# Altium footprint library ADNB95C.PcbLib: 249 footprints (part 3 of 16)
Each footprint in its own frame and in the unit in brackets; x right, y up, seen from the top. Pads: shape width x height; smd on the part's side, far side on the other; paste and mask are expansions set on the pad; w line width, h text height; cw(c..) or ccw(c..) is an arc to the next point about the centre after c.
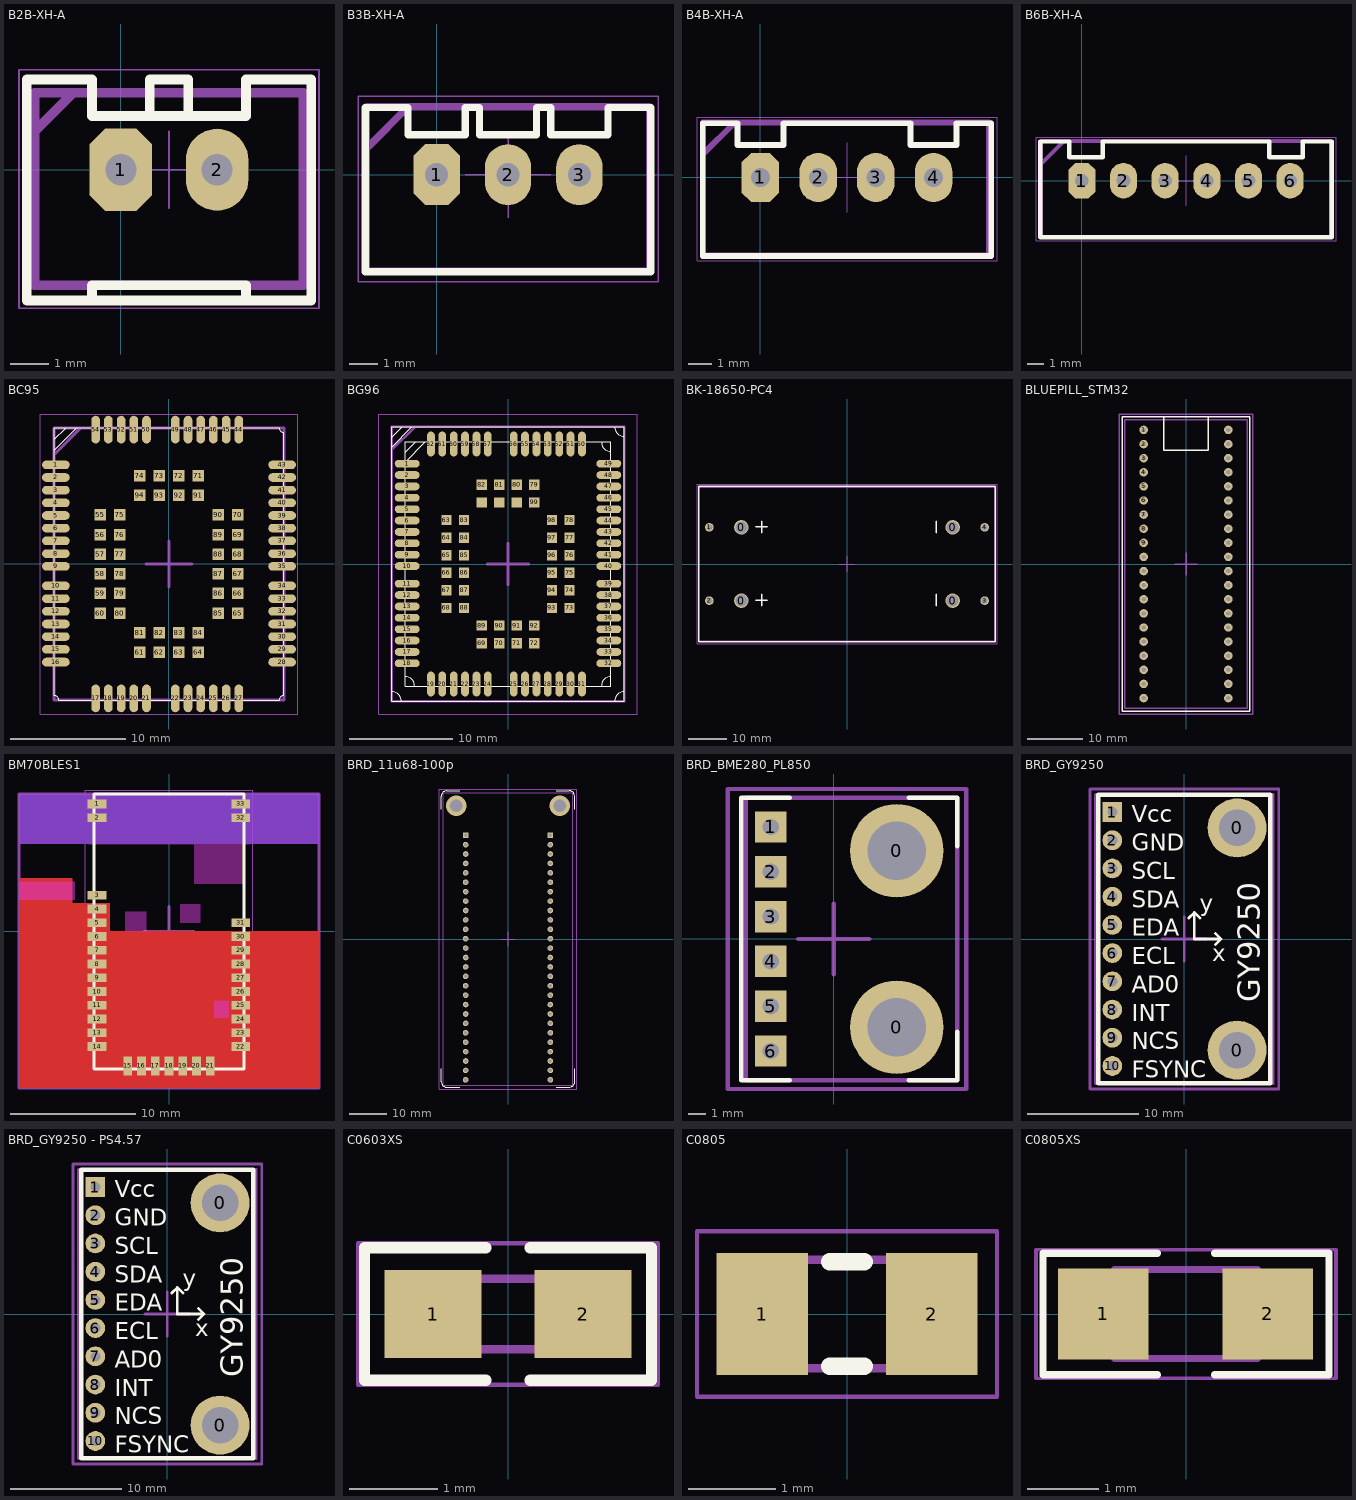
[diagram p2: the footprints below, top view; thin cyan lines are the x and y axes]

## B2B-XH-A [mil] "WAFER Connector 2 Pins,Pitch 2.50mm, Straight Type  Single Row"
height 275.59
pads (2):
  oct 64x84 hole 32: 1(0,0)
  oval 64x84 hole 32: 2(98.43,0)
Top Overlay:
  lines w10: -96.46,90.55 -96.46,-133.86 194.88,-133.86 194.88,90.55 ; -96.46,92.52 -29.53,92.52 -29.53,55.12 127.95,55.12 127.95,92.52 194.88,92.52 ; -29.53,-133.86 -29.53,-118.11 127.95,-118.11 127.95,-133.86 ; 29.53,55.12 29.53,92.52 68.9,92.52 68.9,55.12
Top Designator (Mech7):
  text ".Designator" at -250.69,-108.58 h60
Top Assembly:
  lines w10: -88.58,39.37 -49.21,78.74 ; -88.58,-118.11 -88.58,78.74 187.01,78.74 187.01,-118.11 -88.58,-118.11
Top Courtyard:
  lines w1.97: 9.84,0 88.58,0 ; 49.21,-39.37 49.21,39.37 ; -104.33,-141.73 -104.33,102.36 202.76,102.36 202.76,-141.73 -104.33,-141.73
3D body "User Library-CONN, HDR, 2_5mm X 2.STEP": height 280.5, standoff -149.5, extent -96.28,-133.48 194.72,92.52

## B3B-XH-A [mil] "WAFER Connector 3 Pins,Pitch 2.50mm, Straight Type  Single Row"
height 275.59
pads (3):
  oct 64x84 hole 32: 1(0,0)
  oval 64x84 hole 32: 2(98.43,0) 3(196.85,0)
Top Overlay:
  lines w10: -98.43,90.55 -98.43,-133.86 295.28,-133.86 295.28,90.55 ; -98.43,92.52 -39.37,92.52 -39.37,55.12 39.37,55.12 39.37,92.52 59.06,92.52 59.06,55.12 137.8,55.12 137.8,92.52 157.48,92.52 157.48,55.12 236.22,55.12 236.22,92.52 295.28,92.52
Top Designator (Mech7):
  text ".Designator" at -201.48,-108.58 h60
Top Assembly:
  lines w10: -96.46,39.37 -93.5,39.37 -39.37,93.5 ; -96.46,-132.88 -96.46,93.5 293.3,93.5 293.3,-132.88 -96.46,-132.88
Top Courtyard:
  lines w1.97: 39.37,0 157.48,0 ; 98.43,-59.06 98.43,59.06 ; -108.27,-147.64 -108.27,108.27 305.12,108.27 305.12,-147.64 -108.27,-147.64
3D body "User Library-jst-b3b-xh-a.STEP": height 276.09, standoff -133.36, extent -96.46,-132.88 293.31,93.5

## B4B-XH-A [mil] "WAFER Connector 4 Pins,Pitch 2.50mm, Straight Type  Single Row"
height 275.59
pads (4):
  oct 64x84 hole 32: 1(0,0)
  oval 64x84 hole 32: 2(98.43,0) 3(196.85,0) 4(295.28,0)
Top Overlay:
  lines w10: -98.43,90.55 -98.43,-133.86 393.7,-133.86 393.7,90.55 ; -98.43,92.52 -39.37,92.52 -39.37,55.12 39.37,55.12 39.37,92.52 255.91,92.52 255.91,55.12 334.65,55.12 334.65,92.52 393.7,92.52
Top Designator (Mech7):
  text ".Designator" at -152.27,-108.58 h60
Top Assembly:
  lines w10: -98.42,39.37 -44.29,93.5 -29.53,93.5 ; -98.42,-132.88 389.77,-132.88 389.77,93.5 -98.42,93.5 -98.42,-132.88
Top Courtyard:
  lines w1.97: 88.58,0 206.69,0 ; 147.64,-59.06 147.64,59.06 ; -108.27,-141.73 403.54,-141.73 403.54,102.36 -108.27,102.36 -108.27,-141.73
3D body "User Library-HEADER,JST,BxB-XH-A.sldprt": height 276.09, standoff -133.36, extent -98.42,-132.87 389.77,93.51

## B6B-XH-A [mil] "WAFER Connector 6 Pins,Pitch 2.50mm, Straight Type  Single Row"
height 275.59
pads (6):
  oct 64x84 hole 32: 1(0,0)
  oval 64x84 hole 32: 2(98.43,0) 3(196.85,0) 4(295.28,0) 5(393.7,0) 6(492.13,0)
Top Overlay:
  lines w10: -98.43,-133.86 -98.43,92.52 -29.53,92.52 -29.53,55.12 49.21,55.12 49.21,92.52 442.91,92.52 442.91,55.12 521.65,55.12 521.65,92.52 590.55,92.52 590.55,-133.86 -98.43,-133.86
Top Designator (Mech7):
  text ".Designator" at -53.84,-108.58 h60
Top Assembly:
  lines w10: -96.46,39.37 -42.33,93.5 -29.53,93.5 ; -96.46,-132.88 588.58,-132.88 588.58,93.5 -96.46,93.5 -96.46,-132.88
Top Courtyard:
  lines w1.97: 187.01,0 305.12,0 ; 246.06,-59.06 246.06,59.06 ; -108.27,-141.73 -108.27,102.36 600.39,102.36 600.39,-141.73 -108.27,-141.73
3D body "User Library-jst-b6b-xh-a.STEP": height 276.09, standoff -133.36, extent -96.46,-132.88 588.58,93.5

## BC95 [mm]
height 2.5
pads (94):
  oval 2.4x0.75 smd mask+0.076: 1(-9.8,8.6) 2(-9.8,7.5) 3(-9.8,6.4) 4(-9.8,5.3) 5(-9.8,4.2) 6(-9.8,3.1) 7(-9.8,2) 8(-9.8,0.9) 9(-9.8,-0.2) 10(-9.8,-1.9) 11(-9.8,-3) 12(-9.8,-4.1) 13(-9.8,-5.2) 14(-9.8,-6.3) 15(-9.8,-7.4) 16(-9.8,-8.5) 28(9.8,-8.5) 29(9.8,-7.4) 30(9.8,-6.3) 31(9.8,-5.2) 32(9.8,-4.1) 33(9.8,-3) 34(9.8,-1.9) 35(9.8,-0.2) 36(9.8,0.9) 37(9.8,2) 38(9.8,3.1) 39(9.8,4.2) 40(9.8,5.3) 41(9.8,6.4) 42(9.8,7.5) 43(9.8,8.6)
  oval 0.75x2.4 smd mask+0.076: 17(-6.35,-11.65) 18(-5.25,-11.65) 19(-4.15,-11.65) 20(-3.05,-11.65) 21(-1.95,-11.65) 22(0.55,-11.65) 23(1.65,-11.65) 24(2.75,-11.65) 25(3.85,-11.65) 26(4.95,-11.65) 27(6.05,-11.65) 44(6.05,11.65) 45(4.95,11.65) 46(3.85,11.65) 47(2.75,11.65) 48(1.65,11.65) 49(0.55,11.65) 50(-1.95,11.65) 51(-3.05,11.65) 52(-4.15,11.65) 53(-5.25,11.65) 54(-6.35,11.65)
  rect 1x1 smd mask+0.076: 55(-5.95,4.25) 56(-5.95,2.55) 57(-5.95,0.85) 58(-5.95,-0.85) 59(-5.95,-2.55) 60(-5.95,-4.25) 61(-2.55,-7.65) 62(-0.85,-7.65) 63(0.85,-7.65) 64(2.55,-7.65) 65(5.95,-4.25) 66(5.95,-2.55) 67(5.95,-0.85) 68(5.95,0.85) 69(5.95,2.55) 70(5.95,4.25) 71(2.55,7.65) 72(0.85,7.65) 73(-0.85,7.65) 74(-2.55,7.65) 75(-4.25,4.25) 76(-4.25,2.55) 77(-4.25,0.85) 78(-4.25,-0.85) 79(-4.25,-2.55) 80(-4.25,-4.25) 81(-2.55,-5.95) 82(-0.85,-5.95) 83(0.85,-5.95) 84(2.55,-5.95) 85(4.25,-4.25) 86(4.25,-2.55) 87(4.25,-0.85) 88(4.25,0.85) 89(4.25,2.55) 90(4.25,4.25) 91(2.55,5.95) 92(0.85,5.95) 93(-0.85,5.95) 94(-2.55,5.95)
Top Overlay:
  lines w0.1: -9.95,9.851 -8.001,11.8 -9.271,11.8 ; -9.95,10.033 -9.95,11.375 ; -9.95,10.414 -9.95,11.8 ; -9.931,10.82 -8.966,11.786 ; -8.437,11.8 -9.95,11.8 ; -9.95,11.8 9.55,11.8 ccw(c9.95,11.8) 9.95,11.4 9.95,-11.4 ccw(c9.95,-11.8) 9.55,-11.8 -9.55,-11.8 ccw(c-9.95,-11.8) -9.95,-11.4 -9.95,11.8
Top Designator (Mech7):
  text ".Designator" at -7.618,-0.508 h1.52
Top Assembly:
  lines w0.254: -9.95,9.5 -7.65,11.8 -7.5,11.8 ; -9.95,-11.8 9.95,-11.8 9.95,11.8 -9.95,11.8 -9.95,-11.8
Top Courtyard:
  lines w0.1: -11.15,-13 11.15,-13 11.15,13 -11.15,13 -11.15,-13
  lines w0.254: -2,0 2,0 ; 0,-2 0,2
3D body "BC95_prt.SLDPRT": height 2.2, standoff 0, extent -9.95,-11.8 9.95,11.8

## BG96 [mm] "BG96 IoT NB/Cat.M1 RF Module  Quectel"
height 2.5
pads (102):
  oval 2.4x0.75 smd mask+0.076: 1(-9.75,9.7) 2(-9.75,8.6) 3(-9.75,7.5) 4(-9.75,6.4) 5(-9.75,5.3) 6(-9.75,4.2) 7(-9.75,3.1) 8(-9.75,2) 9(-9.75,0.9) 10(-9.75,-0.2) 11(-9.75,-1.9) 12(-9.75,-3) 13(-9.75,-4.1) 14(-9.75,-5.2) 15(-9.75,-6.3) 16(-9.75,-7.4) 17(-9.75,-8.5) 18(-9.75,-9.6) 32(9.75,-9.6) 33(9.75,-8.5) 34(9.75,-7.4) 35(9.75,-6.3) 36(9.75,-5.2) 37(9.75,-4.1) 38(9.75,-3) 39(9.75,-1.9) 40(9.75,-0.2) 41(9.75,0.9) 42(9.75,2) 43(9.75,3.1) 44(9.75,4.2) 45(9.75,5.3) 46(9.75,6.4) 47(9.75,7.5) 48(9.75,8.6) 49(9.75,9.7)
  oval 0.75x2.4 smd mask+0.076: 19(-7.45,-11.6) 20(-6.35,-11.6) 21(-5.25,-11.6) 22(-4.15,-11.6) 23(-3.05,-11.6) 24(-1.95,-11.6) 25(0.55,-11.6) 26(1.65,-11.6) 27(2.75,-11.6) 28(3.85,-11.6) 29(4.95,-11.6) 30(6.05,-11.6) 31(7.15,-11.6) 50(7.15,11.6) 51(6.05,11.6) 52(4.95,11.6) 53(3.85,11.6) 54(2.75,11.6) 55(1.65,11.6) 56(0.55,11.6) 57(-1.95,11.6) 58(-3.05,11.6) 59(-4.15,11.6) 60(-5.25,11.6) 61(-6.35,11.6) 62(-7.45,11.6)
  rect 1x1 smd mask+0.076: 63(-5.95,4.25) 64(-5.95,2.55) 65(-5.95,0.85) 66(-5.95,-0.85) 67(-5.95,-2.55) 68(-5.95,-4.25) 69(-2.55,-7.65) 70(-0.85,-7.65) 71(0.85,-7.65) 72(2.55,-7.65) 73(5.95,-4.25) 74(5.95,-2.55) 75(5.95,-0.85) 76(5.95,0.85) 77(5.95,2.55) 78(5.95,4.25) 79(2.55,7.65) 80(0.85,7.65) 81(-0.85,7.65) 82(-2.55,7.65) 83(-4.25,4.25) 84(-4.25,2.55) 85(-4.25,0.85) 86(-4.25,-0.85) 87(-4.25,-2.55) 88(-4.25,-4.25) 89(-2.55,-5.95) 90(-0.85,-5.95) 91(0.85,-5.95) 92(2.55,-5.95) 93(4.25,-4.25) 94(4.25,-2.55) 95(4.25,-0.85) 96(4.25,0.85) 97(4.25,2.55) 98(4.25,4.25) 99(2.55,5.95) 100(0.85,5.95) 101(-0.85,5.95) 102(-2.55,5.95)
Top Overlay:
  lines w0.1: -11.25,-12.33 cw(c-11.25,-13.25) -10.33,-13.25 ; -11.25,11.301 -9.301,13.25 ; -11.231,12.27 -10.266,13.236 ; -9.95,-10.88 cw(c-9.95,-11.8) -9.03,-11.8 ; -9.95,9.851 -8.001,11.8 -9.271,11.8 ; -9.95,10.033 -9.95,11.375 ; -9.95,10.414 -9.95,11.8 ; -9.931,10.82 -8.966,11.786 ; -8.437,11.8 -9.95,11.8 ; 9.03,-11.8 cw(c9.95,-11.8) 9.95,-10.88 ; 9.03,11.8 ccw(c9.95,11.8) 9.95,10.88 ; 10.33,-13.25 cw(c11.25,-13.25) 11.25,-12.33 ; 10.33,13.25 ccw(c11.25,13.25) 11.25,12.33 ; -9.95,11.8 9.95,11.8 9.95,-11.8 -9.95,-11.8 -9.95,11.8 ; -11.25,-13.25 11.25,-13.25 11.25,13.25 -11.25,13.25 -11.25,-13.25
Top Designator (Mech7):
  text ".Designator" at -7.618,-0.508 h1.52
Top Assembly:
  lines w0.254: -11.25,11 -9,13.25 ; -9,13.25 -9,13.25 ; -11.25,-13.25 11.25,-13.25 11.25,13.25 -11.25,13.25 -11.25,-13.25
Top Courtyard:
  lines w0.1: -12.5,-14.5 12.5,-14.5 12.5,14.5 -12.5,14.5 -12.5,-14.5
  lines w0.254: -2,0 2,0 ; 0,-2 0,2
3D body "BG96_prt.SLDPRT": height 2.3, standoff 0, extent -11.25,-13.25 11.25,13.25

## BK-18650-PC4 [mm] "18650 Battery Holder 2 cell BK-18650-PC4"
height 21.54
pads (8):
  round 3.81 hole 3.2: 0(-27.81,-9.65) 0(-27.81,9.65) 0(27.81,-9.65) 0(27.81,9.65)
  round 2.286 hole 1.6: 1(-36.25,9.65) 2(-36.25,-9.65) 3(36.25,-9.65) 4(36.25,9.65)
Top Overlay:
  lines w0.4: -24,-9.5 -21,-9.5 ; -24,9.75 -21,9.75 ; -22.5,-11 -22.5,-8 ; -22.5,8.25 -22.5,11.25 ; 23.5,-11 23.5,-8 ; 23.5,8.25 23.5,11.25 ; -39,-20.5 -39,20.5 39,20.5 39,-20.5 -39,-20.5
Top Designator (Mech7):
  text ".Designator" at -7.618,-0.508 h1.52
Top Assembly:
  lines w0.254: -39,-20.25 39,-20.25 39,20.25 -39,20.25 -39,-20.25
Top Courtyard:
  lines w0.254: -2,0 2,0 ; 0,-2 0,2 ; -39.5,-21 -39.5,21 39.5,21 39.5,-21 -39.5,-21
3D body "????? ?????????????? BC-18650-PC4.step": height 21.5, standoff -3.2, extent -39,-20.25 39,20.25

## BLUEPILL_STM32 [mil]
pads (40):
  round 60 hole 30: 1(-300,950) 2(-300,850) 3(-300,750) 4(-300,650) 5(-300,550) 6(-300,450) 7(-300,350) 8(-300,250) 9(-300,150) 10(-300,50) 11(-300,-50) 12(-300,-150) 13(-300,-250) 14(-300,-350) 15(-300,-450) 16(-300,-550) 17(-300,-650) 18(-300,-750) 19(-300,-850) 20(-300,-950) 21(300,-950) 22(300,-850) 23(300,-750) 24(300,-650) 25(300,-550) 26(300,-450) 27(300,-350) 28(300,-250) 29(300,-150) 30(300,-50) 31(300,50) 32(300,150) 33(300,250) 34(300,350) 35(300,450) 36(300,550) 37(300,650) 38(300,750) 39(300,850) 40(300,950)
Top Overlay:
  lines w10: -157.48,1043.31 -157.48,807.09 157.48,807.09 157.48,1043.31 ; -452.76,-1043.31 -452.76,1043.31 452.76,1043.31 452.76,-1043.31 -452.76,-1043.31
Top Designator (Mech7):
  text ".Designator" at -299.9,-19.99 h60
Top Assembly:
  lines w10: -433.07,-1023.62 433.07,-1023.62 433.07,1023.62 -433.07,1023.62 -433.07,-1023.62
Top Courtyard:
  lines w10: -78.74,0 78.74,0 ; 0,-78.74 0,78.74 ; -472.44,-1062.99 -472.44,1062.99 472.44,1062.99 472.44,-1062.99 -472.44,-1062.99
3D body "HDR1x20.SLDPRT": height 334.65, standoff -129.92, extent -350,-1011.81 -250,1011.81
3D body "HDR1x20.SLDPRT": height 335.15, standoff -129.42, extent 250.01,-1011.81 350.01,1011.82

## BM70BLES1 [mm] "Footprint for BM70BLES1FC2"
pads (33):
  rect 1.5x0.7 smd: 1(-5.75,10.2) 2(-5.75,9.1) 3(-5.75,2.9) 4(-5.75,1.8) 5(-5.75,0.7) 6(-5.75,-0.4) 7(-5.75,-1.5) 8(-5.75,-2.6) 9(-5.75,-3.7) 10(-5.75,-4.8) 11(-5.75,-5.9) 12(-5.75,-7) 13(-5.75,-8.1) 14(-5.75,-9.2) 22(5.75,-9.2) 23(5.75,-8.1) 24(5.75,-7) 25(5.75,-5.9) 26(5.75,-4.8) 27(5.75,-3.7) 28(5.75,-2.6) 29(5.75,-1.5) 30(5.75,-0.4) 31(5.75,0.7) 32(5.75,9.1) 33(5.75,10.2)
  rect 0.7x1.5 smd: 15(-3.3,-10.75) 16(-2.2,-10.75) 17(-1.1,-10.75) 18(0,-10.75) 19(1.1,-10.75) 20(2.2,-10.75) 21(3.3,-10.75)
Top Layer:
  pour cut-out: 12,0 -4.75,0 -4.75,2.25 -7.75,2.25 -7.75,4.25 -12,4.25 -12,-12.5 12,-12.5
Top Layer keep-out:
  rectangle: -12,2.5 -7.5,4
  rectangle: -3.5,0 -1.8,1.6
  rectangle: 0.9,0.7 2.5,2.2
  rectangle: 2,3.8 6,7
  rectangle: 3.6,-6.9 4.8,-5.5
  region: -6.4,7 -6.4,8.4 -4.5,8.4 -4.5,11 4.5,11 4.5,8.4 6.4,8.4 6.4,7
Bottom Layer:
  pour cut-out: 12,0 12,-12.5 -12,-12.5 -12,2.25 -4.75,2.25 -4.75,0
Bottom Layer keep-out:
  rectangle: -12,7 12,11
Top Overlay:
  lines w0.254: -6,-11 6,-11 6,11 -6,11 -6,-11
Mechanical 1:
  lines w0.254: -12,-12.5 12,-12.5 12,11 -12,11 -12,-12.5
Top Designator (Mech7):
  text ".Designator" at -7.618,-1.146 h1.52
Top Assembly:
  lines w0.1: -6,-11 6,-11 6,11 -6,11 -6,-11
Top Courtyard:
  lines w0.1: -6.7,-11.7 6.7,-11.7 6.7,11.3 -6.7,11.3 -6.7,-11.7
  lines w0.254: -2,0 2,0 ; 0,-2 0,2
3D body "RN4870 v4.step": height 2.42, standoff 0.01, extent -6,-11 6,11

## BRD_11u68-100p [mil]
pads (54):
  rect 60x60 hole 35.43: 1(-450,1103.15) 28(450,1103.15)
  round 60 hole 35.43: 2(-450,1003.15) 3(-450,903.15) 4(-450,803.15) 5(-450,703.15) 6(-450,603.15) 7(-450,503.15) 8(-450,403.15) 9(-450,303.15) 10(-450,203.15) 11(-450,103.15) 12(-450,3.15) 13(-450,-96.85) 14(-450,-196.85) 15(-450,-296.85) 16(-450,-396.85) 17(-450,-496.85) 18(-450,-596.85) 19(-450,-696.85) 20(-450,-796.85) 21(-450,-896.85) 22(-450,-996.85) 23(-450,-1096.85) 24(-450,-1196.85) 25(-450,-1296.85) 26(-450,-1396.85) 27(-450,-1496.85) 29(450,1003.15) 30(450,903.15) 31(450,803.15) 32(450,703.15) 33(450,603.15) 34(450,503.15) 35(450,403.15) 36(450,303.15) 37(450,203.15) 38(450,103.15) 39(450,3.15) 40(450,-96.85) 41(450,-196.85) 42(450,-296.85) 43(450,-396.85) 44(450,-496.85) 45(450,-596.85) 46(450,-696.85) 47(450,-796.85) 48(450,-896.85) 49(450,-996.85) 50(450,-1096.85) 51(450,-1196.85) 52(450,-1296.85) 53(450,-1396.85) 54(450,-1496.85)
via 551.18,1416.53 diameter 216.54 hole 129.92
via -551.18,1416.53 diameter 216.54 hole 129.92
Top Overlay:
  lines w10: -709.45,1377.95 -709.45,1514.96 ; -709.45,1515.75 cw(c-650.39,1515.75) -650.39,1574.8 ; -708.66,-1516.54 ccw(c-649.61,-1516.54) -649.61,-1575.59 ; -708.66,-1515.75 -708.66,-1377.95 ; -649.61,1574.8 -511.81,1574.8 ; -648.82,-1575.59 -511.81,-1575.59 ; 511.81,-1574.8 649.61,-1574.8 ; 511.81,1575.59 648.82,1575.59 ; 649.61,1575.59 cw(c649.61,1516.54) 708.66,1516.54 ; 650.39,-1574.8 ccw(c650.39,-1515.75) 709.45,-1515.75 ; 708.66,1377.95 708.66,1515.75 ; 709.45,-1514.96 709.45,-1377.95
Top Designator (Mech7):
  text ".Designator" at -299.9,-19.99 h60
Top Assembly:
  lines w10: -688.98,-1555.12 -688.98,1555.12 688.98,1555.12 688.98,-1555.12 -688.98,-1555.12
Top Courtyard:
  lines w10: -78.74,0 78.74,0 ; 0,-78.74 0,78.74 ; -728.35,-1594.49 728.35,-1594.49 728.35,1594.49 -728.35,1594.49 -728.35,-1594.49
3D body "1x27F_HEADER.SLDPRT": height 334.65, standoff -137.8, extent 400,-1535.04 500,1164.96
3D body "1x27F_HEADER.SLDPRT": height 334.65, standoff -137.8, extent -500,-1535.04 -400,1164.96

## BRD_BME280_PL850 [mil] "SAMTECH 2.54mm Header 4.85mm insulator"
height 179.92
pads (8):
  round 208.66 hole 129.92: 0(140.62,-196.85) 0(140.62,196.85)
  rect 70x70 hole 36: 1(-140.62,250) 2(-140.62,150) 3(-140.62,50) 4(-140.62,-50) 5(-140.62,-150) 6(-140.62,-250)
Top Overlay:
  lines w10: -98.43,-314.96 -206.69,-314.96 -206.69,314.96 -98.43,314.96 ; 167.32,-314.96 275.59,-314.96 275.59,-206.69 ; 167.32,314.96 275.59,314.96 275.59,206.69
Top Designator (Mech7):
  text ".Designator" at -265.45,-19.99 h60
Top Assembly:
  lines w10: -196.85,-314.96 -196.85,314.96 275.59,314.96 275.59,-314.96 -196.85,-314.96
Top Courtyard:
  lines w10: -78.74,0 78.74,0 ; 0,-78.74 0,78.74 ; -236.22,-334.65 295.27,-334.65 295.27,334.65 -236.22,334.65 -236.22,-334.65
3D body "female_header_a-bl254-eg-g06d.stp": height 335.15, standoff -125.48, extent -189.84,-305.71 -91.42,304.14

## BRD_GY9250 [mil]
height 334.65
pads (12):
  round 208.66 hole 129.92: 0(187.01,-393.7) 0(187.01,393.7)
  rect 70x70 hole 36: 1(-255.12,450)
  round 70 hole 36: 2(-255.12,350) 3(-255.12,250) 4(-255.12,150) 5(-255.12,50) 6(-255.12,-50) 7(-255.12,-150) 8(-255.12,-250) 9(-255.12,-350) 10(-255.12,-450)
Top Overlay:
  lines w10: 15.75,74.8 35.43,94.49 ; 55.12,74.8 35.43,94.49 ; 110.24,-19.68 129.92,0 ; 110.24,19.68 129.92,0 ; 35.43,94.49 35.43,0 129.92,0
  lines w15.75: -305.12,-511.81 -305.12,511.81 305.12,511.81 305.12,-511.81 -305.12,-511.81
  text "Vcc" at -187.01,413.39 h60
  text "GND" at -187.01,312.77 h60
  text "SCL" at -187.01,212.16 h60
  text "SDA" at -187.01,111.55 h60
  text "EDA" at -187.01,10.94 h60
  text "ECL" at -187.01,-89.68 h60
  text "AD0" at -187.01,-190.29 h60
  text "INT" at -187.01,-290.9 h60
  text "NCS" at -187.01,-391.51 h60
  text "FSYNC" at -187.01,-492.13 h60
  text "GY9250" at 267.72,-224.41 h78.74
  text "x" at 98.43,-78.74 h60
  text "y" at 55.12,98.43 h60
Top Designator (Mech7):
  text ".Designator" at -299.9,-19.99 h60
Top Assembly:
  lines w10: -314.96,-511.81 314.96,-511.81 314.96,511.81 -314.96,511.81 -314.96,-511.81
Top Courtyard:
  lines w10: -78.74,0 78.74,0 ; 0,-78.74 0,78.74 ; -334.65,-531.5 -334.65,531.5 334.65,531.5 334.65,-531.5 -334.65,-531.5
3D body "female_header_a-bl254-eg-g10d.stp": height 335.15, standoff -125.48, extent -304.33,-504.92 -205.9,504.92

## BRD_GY9250 - PS4.57 [mil] "SAMTECH 2.54mm Header 4.57mm insulator"
height 179.92
pads (12):
  round 208.66 hole 129.92: 0(187.01,-393.7) 0(187.01,393.7)
  rect 70x70 hole 36: 1(-255.12,450)
  round 70 hole 36: 2(-255.12,350) 3(-255.12,250) 4(-255.12,150) 5(-255.12,50) 6(-255.12,-50) 7(-255.12,-150) 8(-255.12,-250) 9(-255.12,-350) 10(-255.12,-450)
Top Overlay:
  lines w10: 15.75,74.8 35.43,94.49 ; 55.12,74.8 35.43,94.49 ; 110.24,-19.68 129.92,0 ; 110.24,19.68 129.92,0 ; 35.43,94.49 35.43,0 129.92,0
  lines w15.75: -305.12,-511.81 -305.12,511.81 305.12,511.81 305.12,-511.81 -305.12,-511.81
  text "Vcc" at -187.01,413.39 h60
  text "GND" at -187.01,312.77 h60
  text "SCL" at -187.01,212.16 h60
  text "SDA" at -187.01,111.55 h60
  text "EDA" at -187.01,10.94 h60
  text "ECL" at -187.01,-89.68 h60
  text "AD0" at -187.01,-190.29 h60
  text "INT" at -187.01,-290.9 h60
  text "NCS" at -187.01,-391.51 h60
  text "FSYNC" at -187.01,-492.13 h60
  text "GY9250" at 267.72,-224.41 h78.74
  text "x" at 98.43,-78.74 h60
  text "y" at 55.12,98.43 h60
Top Designator (Mech7):
  text ".Designator" at -299.9,-19.99 h60
Top Assembly:
  lines w10: -314.96,-511.81 314.96,-511.81 314.96,511.81 -314.96,511.81 -314.96,-511.81
Top Courtyard:
  lines w10: -78.74,0 78.74,0 ; 0,-78.74 0,78.74 ; -334.65,-531.5 -334.65,531.5 334.65,531.5 334.65,-531.5 -334.65,-531.5
3D body "SAMTEC_1x10HDR457.SLDPRT": height 179.92, standoff -114.96, extent -305.11,-500 -205.11,500

## C0603XS [mm] "Chip Capacitor; Body 1.6 x 0.8 mm (LxW typ)"
height 0.6
pads (2):
  rect 1.1x1 smd: 1(-0.85,0) 2(0.85,0)
Top Overlay:
  lines w0.127: -0.25,-0.75 -1.625,-0.75 -1.625,0.75 -0.25,0.75 ; 0.25,-0.75 1.625,-0.75 1.625,0.75 0.25,0.75
Top Designator (Mech7):
  text "'.Designator'" at -4.317,-0.317 h0.76
Top Assembly:
  lines w0.1: -0.8,-0.4 0.8,-0.4 0.8,0.4 -0.8,0.4 -0.8,-0.4
Top Courtyard:
  lines w0.05: -1.7,-0.8 1.7,-0.8 1.7,0.8 -1.7,0.8 -1.7,-0.8
3D body "User Library-C0603-2.STEP": height 0.8, standoff 0, extent -0.8,-0.4 0.8,0.4

## C0805 [mm]
height 0.65
pads (2):
  rect 1.05x1.4 smd: 1(-0.975,0) 2(0.975,0)
Top Overlay:
  lines w0.2: -0.2,-0.6 0.2,-0.6 ; -0.2,0.6 0.2,0.6
Top Designator (Mech7):
  text ".Designator" at -3.809,-0.254 h0.76
Top Assembly:
  lines w0.1: -1,-0.625 -1,0.625 1,0.625 1,-0.625 -1,-0.625
Top Courtyard:
  lines w0.05: -1.725,-0.95 -1.725,0.95 1.725,0.95 1.725,-0.95 -1.725,-0.95
3D body "User Library-C0805-2.STEP": height 0.8, standoff 0, extent -1,-0.625 1,0.625

## C0805XS [mil] "Chip Capacitor;"
height 23.62
pads (2):
  rect 50x50 smd: 1(-45.55,0) 2(45,0)
Top Overlay:
  lines w3.94: -15.75,-33.47 -78.74,-33.47 -78.74,33.46 -15.75,33.46 ; 15.75,-33.47 78.74,-33.47 78.74,33.46 15.75,33.46
Top Designator (Mech7):
  text ".Designator" at -149.95,-10 h30
Top Assembly:
  lines w3.94: -39.36,-24.6 39.38,-24.6 39.38,24.61 -39.36,24.61 -39.36,-24.6
Top Courtyard:
  lines w1.97: -82.68,-35.43 -82.68,35.43 82.68,35.43 82.68,-35.43 -82.68,-35.43
3D body "User Library-C0805-2.STEP": height 31.5, standoff 0, extent -39.37,-24.6 39.37,24.61